# Altium footprint library CD's_LIB_2018.PcbLib: 155 footprints (part 3 of 10)
Each footprint in its own frame and in the unit in brackets; x right, y up, seen from the top. Pads: shape width x height; smd on the part's side, far side on the other; paste and mask are expansions set on the pad; w line width, h text height; cw(c..) or ccw(c..) is an arc to the next point about the centre after c.
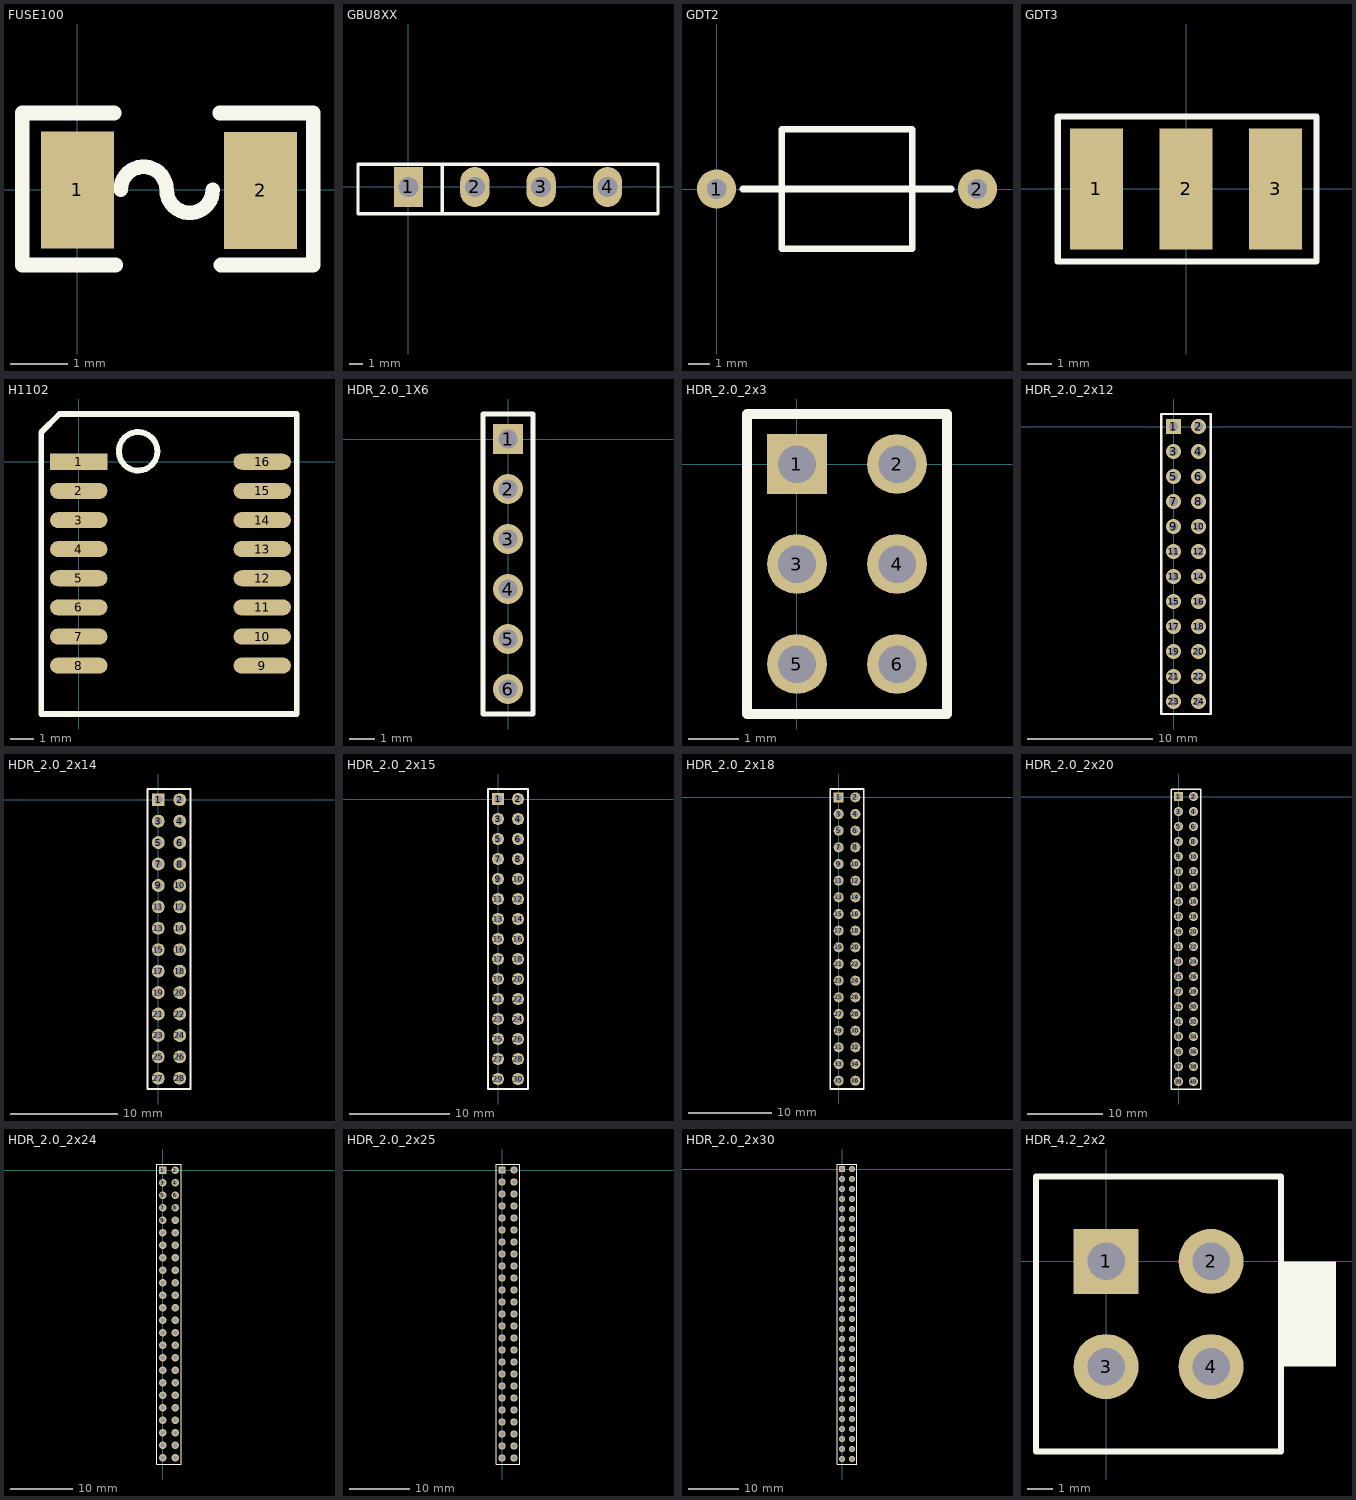
[diagram p2: the footprints below, top view; thin cyan lines are the x and y axes]

## FUSE100 [mil]
pads (2):
  rect 50x80 smd: 1(0,0) 2(125.17,-0.43)
Top Overlay:
  lines w10: 25.17,52.57 -37.83,52.57 -37.83,-51.43 26.17,-51.43 ; 29.5,0 cw(c45.25,0) 61,0 ccw(c76.75,0) 92.5,0 ; 97.17,52.57 161.17,52.57 161.17,-51.43 98.17,-51.43
3D body: height 39.37, standoff 0, extent -0.5,-31.71 125.69,31.28

## GBU8XX [mm] "整流桥"
pads (4):
  rect 2.2x3 hole 1.5: 1(0,0)
  oval 2.2x3 hole 1.5: 2(5,0) 3(10,0) 4(15,0)
Top Overlay:
  lines w0.25: -3.8,-2.007 18.8,-2.007 18.8,1.702 -3.8,1.702 -3.8,-1.998 ; 2.54,-2.007 2.54,1.702

## GDT2 [mm]
pads (2):
  round 1.8 hole 0.9: 1(0,0) 2(12,0)
Top Overlay:
  lines w0.3: 1.2,0 10.8,0 ; 3,-2.75 3,2.75 9,2.75 9,-2.75 3,-2.75

## GDT3 [mm]
pads (3):
  rect 2.2x5 smd: 1(-3.7,0) 2(0,0) 3(3.7,0)
Top Overlay:
  lines w0.254: -5.3,-3 5.4,-3 5.4,3 -5.3,3 -5.3,-3

## H1102 [mm]
pads (16):
  rect 2.5x0.7 smd: 1(0,0)
  oval 2.5x0.7 smd: 2(0,-1.27) 3(0,-2.54) 4(0,-3.81) 5(0,-5.08) 6(0,-6.35) 7(0,-7.62) 8(0,-8.89) 9(8.001,-8.89) 10(8.001,-7.62) 11(8.001,-6.35) 12(8.001,-5.08) 13(8.001,-3.81) 14(8.001,-2.54) 15(8.001,-1.27) 16(8.001,0)
Top Overlay:
  circle w0.254: c2.588,0.457 r0.841
  lines w0.254: -1.637,-10.998 9.506,-10.998 9.506,2.083 -0.837,2.083 -1.637,1.283 -1.637,-10.998
3D body: height 5.1, standoff 0, extent -0.699,-10.795 8.701,1.905

## HDR_2.0_1X6 [mm] "2.0mm排针"
pads (6):
  rect 1.2x1.2 hole 0.75: 1(0,0)
  round 1.2 hole 0.75: 2(0,-2) 3(0,-4) 4(0,-6) 5(0,-8) 6(0,-10)
Top Overlay:
  lines w0.2: -1,-11 -1,1 1,1 1,-11 -1,-11

## HDR_2.0_2x3 [mm] "2.0mm排针"
pads (6):
  rect 1.2x1.2 hole 0.75: 1(0,0)
  round 1.2 hole 0.75: 2(2,0) 3(0,-2) 4(2,-2) 5(0,-4) 6(2,-4)
Top Overlay:
  lines w0.2: -1,-5 3,-5 3,1 -1,1 -1,-5

## HDR_2.0_2x12 [mm] "2.0mm排针"
pads (24):
  rect 1.2x1.2 hole 0.75: 1(0,0)
  round 1.2 hole 0.75: 2(2,0) 3(0,-2) 4(2,-2) 5(0,-4) 6(2,-4) 7(0,-6) 8(2,-6) 9(0,-8) 10(2,-8) 11(0,-10) 12(2,-10) 13(0,-12) 14(2,-12) 15(0,-14) 16(2,-14) 17(0,-16) 18(2,-16) 19(0,-18) 20(2,-18) 21(0,-20) 22(2,-20) 23(0,-22) 24(2,-22)
Top Overlay:
  lines w0.2: -1,-23 3,-23 3,1 -1,1 -1,-23

## HDR_2.0_2x14 [mm] "2.0mm排针"
pads (28):
  rect 1.2x1.2 hole 0.75: 1(0,0)
  round 1.2 hole 0.75: 2(2,0) 3(0,-2) 4(2,-2) 5(0,-4) 6(2,-4) 7(0,-6) 8(2,-6) 9(0,-8) 10(2,-8) 11(0,-10) 12(2,-10) 13(0,-12) 14(2,-12) 15(0,-14) 16(2,-14) 17(0,-16) 18(2,-16) 19(0,-18) 20(2,-18) 21(0,-20) 22(2,-20) 23(0,-22) 24(2,-22) 25(0,-24) 26(2,-24) 27(0,-26) 28(2,-26)
Top Overlay:
  lines w0.2: -1,-27 3,-27 3,1 -1,1 -1,-27

## HDR_2.0_2x15 [mm] "2.0mm排针"
pads (30):
  rect 1.2x1.2 hole 0.75: 1(0,0)
  round 1.2 hole 0.75: 2(2,0) 3(0,-2) 4(2,-2) 5(0,-4) 6(2,-4) 7(0,-6) 8(2,-6) 9(0,-8) 10(2,-8) 11(0,-10) 12(2,-10) 13(0,-12) 14(2,-12) 15(0,-14) 16(2,-14) 17(0,-16) 18(2,-16) 19(0,-18) 20(2,-18) 21(0,-20) 22(2,-20) 23(0,-22) 24(2,-22) 25(0,-24) 26(2,-24) 27(0,-26) 28(2,-26) 29(0,-28) 30(2,-28)
Top Overlay:
  lines w0.2: -1,-29 -1,1 3,1 3,-29 -1,-29

## HDR_2.0_2x18 [mm] "2.0mm排针"
pads (36):
  rect 1.2x1.2 hole 0.75: 1(0,0)
  round 1.2 hole 0.75: 2(2,0) 3(0,-2) 4(2,-2) 5(0,-4) 6(2,-4) 7(0,-6) 8(2,-6) 9(0,-8) 10(2,-8) 11(0,-10) 12(2,-10) 13(0,-12) 14(2,-12) 15(0,-14) 16(2,-14) 17(0,-16) 18(2,-16) 19(0,-18) 20(2,-18) 21(0,-20) 22(2,-20) 23(0,-22) 24(2,-22) 25(0,-24) 26(2,-24) 27(0,-26) 28(2,-26) 29(0,-28) 30(2,-28) 31(0,-30) 32(2,-30) 33(0,-32) 34(2,-32) 35(0,-34) 36(2,-34)
Top Overlay:
  lines w0.2: -1,-35 -1,1 3,1 3,-35 -1,-35

## HDR_2.0_2x20 [mm] "2.0mm排针"
pads (40):
  rect 1.2x1.2 hole 0.75: 1(0,0)
  round 1.2 hole 0.75: 2(2,0) 3(0,-2) 4(2,-2) 5(0,-4) 6(2,-4) 7(0,-6) 8(2,-6) 9(0,-8) 10(2,-8) 11(0,-10) 12(2,-10) 13(0,-12) 14(2,-12) 15(0,-14) 16(2,-14) 17(0,-16) 18(2,-16) 19(0,-18) 20(2,-18) 21(0,-20) 22(2,-20) 23(0,-22) 24(2,-22) 25(0,-24) 26(2,-24) 27(0,-26) 28(2,-26) 29(0,-28) 30(2,-28) 31(0,-30) 32(2,-30) 33(0,-32) 34(2,-32) 35(0,-34) 36(2,-34) 37(0,-36) 38(2,-36) 39(0,-38) 40(2,-38)
Top Overlay:
  lines w0.2: -1,-39 3,-39 3,1 -1,1 -1,-39

## HDR_2.0_2x24 [mm] "2.0mm排针"
pads (48):
  rect 1.2x1.2 hole 0.75: 1(0,0)
  round 1.2 hole 0.75: 2(2,0) 3(0,-2) 4(2,-2) 5(0,-4) 6(2,-4) 7(0,-6) 8(2,-6) 9(0,-8) 10(2,-8) 11(0,-10) 12(2,-10) 13(0,-12) 14(2,-12) 15(0,-14) 16(2,-14) 17(0,-16) 18(2,-16) 19(0,-18) 20(2,-18) 21(0,-20) 22(2,-20) 23(0,-22) 24(2,-22) 25(0,-24) 26(2,-24) 27(0,-26) 28(2,-26) 29(0,-28) 30(2,-28) 31(0,-30) 32(2,-30) 33(0,-32) 34(2,-32) 35(0,-34) 36(2,-34) 37(0,-36) 38(2,-36) 39(0,-38) 40(2,-38) 41(0,-40) 42(2,-40) 43(0,-42) 44(2,-42) 45(0,-44) 46(2,-44) 47(0,-46) 48(2,-46)
Top Overlay:
  lines w0.2: -1,-47 3,-47 3,1 -1,1 -1,-47

## HDR_2.0_2x25 [mm] "2.0mm排针"
pads (50):
  rect 1.2x1.2 hole 0.75: 1(0,0)
  round 1.2 hole 0.75: 2(2,0) 3(0,-2) 4(2,-2) 5(0,-4) 6(2,-4) 7(0,-6) 8(2,-6) 9(0,-8) 10(2,-8) 11(0,-10) 12(2,-10) 13(0,-12) 14(2,-12) 15(0,-14) 16(2,-14) 17(0,-16) 18(2,-16) 19(0,-18) 20(2,-18) 21(0,-20) 22(2,-20) 23(0,-22) 24(2,-22) 25(0,-24) 26(2,-24) 27(0,-26) 28(2,-26) 29(0,-28) 30(2,-28) 31(0,-30) 32(2,-30) 33(0,-32) 34(2,-32) 35(0,-34) 36(2,-34) 37(0,-36) 38(2,-36) 39(0,-38) 40(2,-38) 41(0,-40) 42(2,-40) 43(0,-42) 44(2,-42) 45(0,-44) 46(2,-44) 47(0,-46) 48(2,-46) 49(0,-48) 50(2,-48)
Top Overlay:
  lines w0.2: -1,-49 -1,1 3,1 3,-49 -1,-49

## HDR_2.0_2x30 [mm] "2.0mm排针"
pads (60):
  rect 1.2x1.2 hole 0.75: 1(0,0)
  round 1.2 hole 0.75: 2(2,0) 3(0,-2) 4(2,-2) 5(0,-4) 6(2,-4) 7(0,-6) 8(2,-6) 9(0,-8) 10(2,-8) 11(0,-10) 12(2,-10) 13(0,-12) 14(2,-12) 15(0,-14) 16(2,-14) 17(0,-16) 18(2,-16) 19(0,-18) 20(2,-18) 21(0,-20) 22(2,-20) 23(0,-22) 24(2,-22) 25(0,-24) 26(2,-24) 27(0,-26) 28(2,-26) 29(0,-28) 30(2,-28) 31(0,-30) 32(2,-30) 33(0,-32) 34(2,-32) 35(0,-34) 36(2,-34) 37(0,-36) 38(2,-36) 39(0,-38) 40(2,-38) 41(0,-40) 42(2,-40) 43(0,-42) 44(2,-42) 45(0,-44) 46(2,-44) 47(0,-46) 48(2,-46) 49(0,-48) 50(2,-48) 51(0,-50) 52(2,-50) 53(0,-52) 54(2,-52) 55(0,-54) 56(2,-54) 57(0,-56) 58(2,-56) 59(0,-58) 60(2,-58)
Top Overlay:
  lines w0.2: -1,-59 -1,1 3,1 3,-59 -1,-59

## HDR_4.2_2x2 [mm]
pads (4):
  rect 2.6x2.6 hole 1.5: 1(0,0)
  round 2.6 hole 1.5: 2(4.2,0) 3(0,-4.2) 4(4.2,-4.2)
Top Overlay:
  rectangle: 7.096,-4.2 9.196,0
  lines w0.25: -2.8,-7.6 7,-7.6 7,3.4 -2.8,3.4 -2.8,-7.6